# Altium footprint library PCBLIB.PcbLib: 775 footprints (part 49 of 49)
Each footprint in its own frame and in the unit in brackets; x right, y up, seen from the top. Pads: shape width x height; smd on the part's side, far side on the other; paste and mask are expansions set on the pad; w line width, h text height; cw(c..) or ccw(c..) is an arc to the next point about the centre after c.
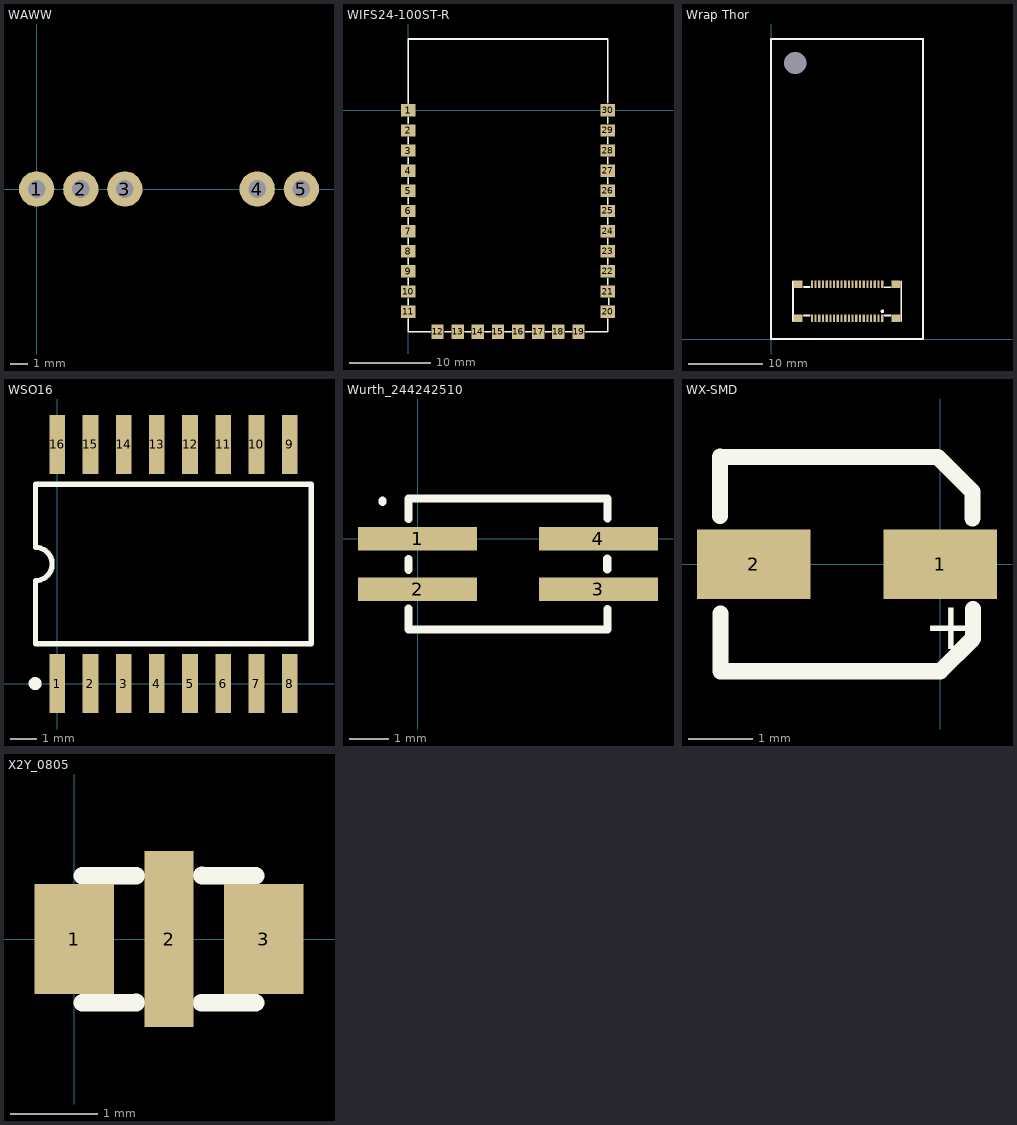
[diagram p48: the footprints below, top view; thin cyan lines are the x and y axes]

## WAWW [mil]
height 10
pads (5):
  round 80 hole 40: 1(0,0) 2(100,0) 3(200,0) 4(500,0) 5(600,0)

## WIFS24-100ST-R [mil]
height 5
pads (30):
  rect 70x60 smd: 1(0,0) 2(0,-98) 3(0,-196) 4(0,-294) 5(0,-392) 6(-0.22,-490) 7(0,-588) 8(-0.22,-686) 9(0,-784) 10(-0.39,-881.9) 11(0,-980) 20(972,-980) 21(972,-882) 22(972,-784) 23(972,-686) 24(972,-588) 25(972,-490) 26(972,-392) 27(972,-294) 28(972,-196) 29(972,-98) 30(972,0)
  rect 60x70 smd: 12(143,-1078) 13(241,-1078) 14(339,-1078) 15(437,-1078) 16(535,-1078) 17(633,-1078) 18(731,-1078) 19(829,-1078)
TopOverlay:
  lines w8: -0.5,-328.83 -0.39,-357.44 ; -0.39,-945.38 -0.39,-916.66 ; -0.39,-847.48 -0.39,-818.2 ; -0.39,-749.47 -0.39,-720.3 ; -0.39,-651.24 -0.39,-622.74 ; -0.39,-553.34 -0.39,-524.4 ; -0.39,-455.45 -0.39,-426.73 ; -0.39,-259.32 -0.39,-230.26 ; -0.39,-161.65 -0.39,-132.7 ; -0.39,-63.41 -0.27,-34.36 ; 0,-1014.66 0,-1078 108.69,-1078 ; 0,34.59 0,347 972,347 972,35.97 ; 177.19,-1078.03 206.47,-1077.92 ; 275.42,-1078 304.59,-1078 ; 373.54,-1078.03 402.38,-1078.03 ; 471.22,-1078.03 500.72,-1078.03 ; 569.11,-1078.03 598.5,-1078.03 ; 667.12,-1078.03 696.62,-1078.03 ; 765.24,-1078.03 794.75,-1078.03 ; 863.27,-1078.37 972,-1078.37 972,-1014.33 ; 972,-847.7 972,-818.2 ; 972,-749.58 972,-720.42 ; 972,-651.35 972,-622.41 ; 972,-553.57 972,-524.18 ; 972,-455.67 972,-426.17 ; 972,-357.89 972,-328.16 ; 972,-258.76 972,-228.36 ; 972,-161.31 972,-132.7 ; 972,-63.86 972,-34.36 ; 976,-945.49 976,-916.21

## Wrap Thor [mm] "AMP 4-353512-0"
pads (46):
  rect 0.3x1 smd: 1(15.007,2.79) 2(15.007,7.39) 3(14.507,2.79) 4(14.507,7.38) 5(14.007,2.79) 6(14.007,7.39) 7(13.507,2.79) 8(13.507,7.39) 9(13.007,2.79) 10(13.007,7.39) 11(12.507,2.79) 12(12.507,7.39) 13(12.007,2.79) 14(12.007,7.39) 15(11.507,2.79) 16(11.507,7.39) 17(11.007,2.79) 18(11.007,7.39) 19(10.507,2.79) 20(10.507,7.39) 21(10.007,2.79) 22(10.007,7.39) 23(9.507,2.79) 24(9.507,7.39) 25(9.007,2.79) 26(9.007,7.39) 27(8.507,2.79) 28(8.507,7.39) 29(8.007,2.79) 30(8.007,7.39) 31(7.507,2.79) 32(7.507,7.39) 33(7.007,2.79) 34(7.007,7.39) 35(6.507,2.79) 36(6.507,7.39) 37(6.007,2.79) 38(6.007,7.39) 39(5.507,2.79) 40(5.507,7.39)
  round 0 hole 3 unplated: MH(3.25,37.25)
  rect 1.2x1.05 smd: ""(3.657,2.79) ""(3.657,7.39)
  round 0.5 on Top Overlay: ""(15.027,3.74)
  rect 1.2x1 smd: ""(16.857,2.79) ""(16.857,7.39)
TopOverlay:
  lines w0.254: 2.937,2.39 2.937,7.8 ; 4.407,3.19 5.207,3.19 ; 4.407,7.01 5.197,7.01 ; 15.307,3.19 16.107,3.19 ; 15.307,6.99 16.107,6.99 ; 17.567,2.42 17.567,7.76 ; 0,0 20.5,0 20.5,40.5 0,40.5 0,0

## WSO16 [mm]
pads (16):
  rect 0.6x2.25 smd: 1(0,0) 2(1.27,0) 3(2.54,0) 4(3.81,0) 5(5.08,0) 6(6.35,0) 7(7.62,0) 8(8.89,0) 9(8.89,9.15) 10(7.62,9.15) 11(6.35,9.15) 12(5.08,9.15) 13(3.81,9.15) 14(2.54,9.15) 15(1.27,9.15) 16(0,9.15)
TopOverlay:
  circle w0.25: c-0.85,0 r0.125
  lines w0.2: -0.83,1.525 -0.83,3.94 ccw(c-0.83,4.575) -0.83,5.21 -0.83,7.625 9.72,7.625 9.72,1.525 -0.83,1.525

## Wurth_244242510 [mm]
height 2.54
pads (4):
  rect 3x0.6 smd: 1(0,0) 2(0,-1.27) 3(4.55,-1.27) 4(4.55,0)
TopOverlay:
  lines w0.203: -0.889,0.925 -0.889,0.961 ; -0.23,-0.779 -0.23,-0.507 ; -0.225,-1.759 -0.225,-2.285 4.775,-2.285 4.775,-1.763 ; -0.225,0.503 -0.225,1.015 4.775,1.015 4.775,0.506 ; 4.773,-0.775 4.773,-0.5

## WX-SMD [mil]
height 212.6
pads (2):
  rect 70x43 smd: 1(0,0) 2(-115,0)
TopOverlay:
  lines w10: -135.79,29.62 -135.79,66.19 -135.6,66 -20.93,66 ; -135.48,-30.45 -135.48,-66.03 0,-66.03 20.18,-45.85 20.18,-27.61 ; -20.84,66.1 -1.51,66.1 3.83,60.75 14.52,50.06 19.87,44.71 19.87,41.88 19.87,28.25
  text "+" at -10.41,-52.42 h30
Mechanical4:
  text ".235" at -157.48,0 h1

## X2Y_0805 [mil]
height 37.4
pads (3):
  rect 36x50 smd: 1(0,0) 3(86.05,0)
  rect 22.1x80 smd: 2(43.03,0)
TopOverlay:
  lines w8: 3.66,-28.85 28.09,-28.77 ; 3.66,28.7 28.25,28.62 ; 57.77,-28.85 82.4,-28.85 ; 57.99,28.77 82.4,28.7